# Altium footprint library PcbLib.PcbLib: 141 footprints (part 3 of 9)
Each footprint in its own frame and in the unit in brackets; x right, y up, seen from the top. Pads: shape width x height; smd on the part's side, far side on the other; paste and mask are expansions set on the pad; w line width, h text height; cw(c..) or ccw(c..) is an arc to the next point about the centre after c.
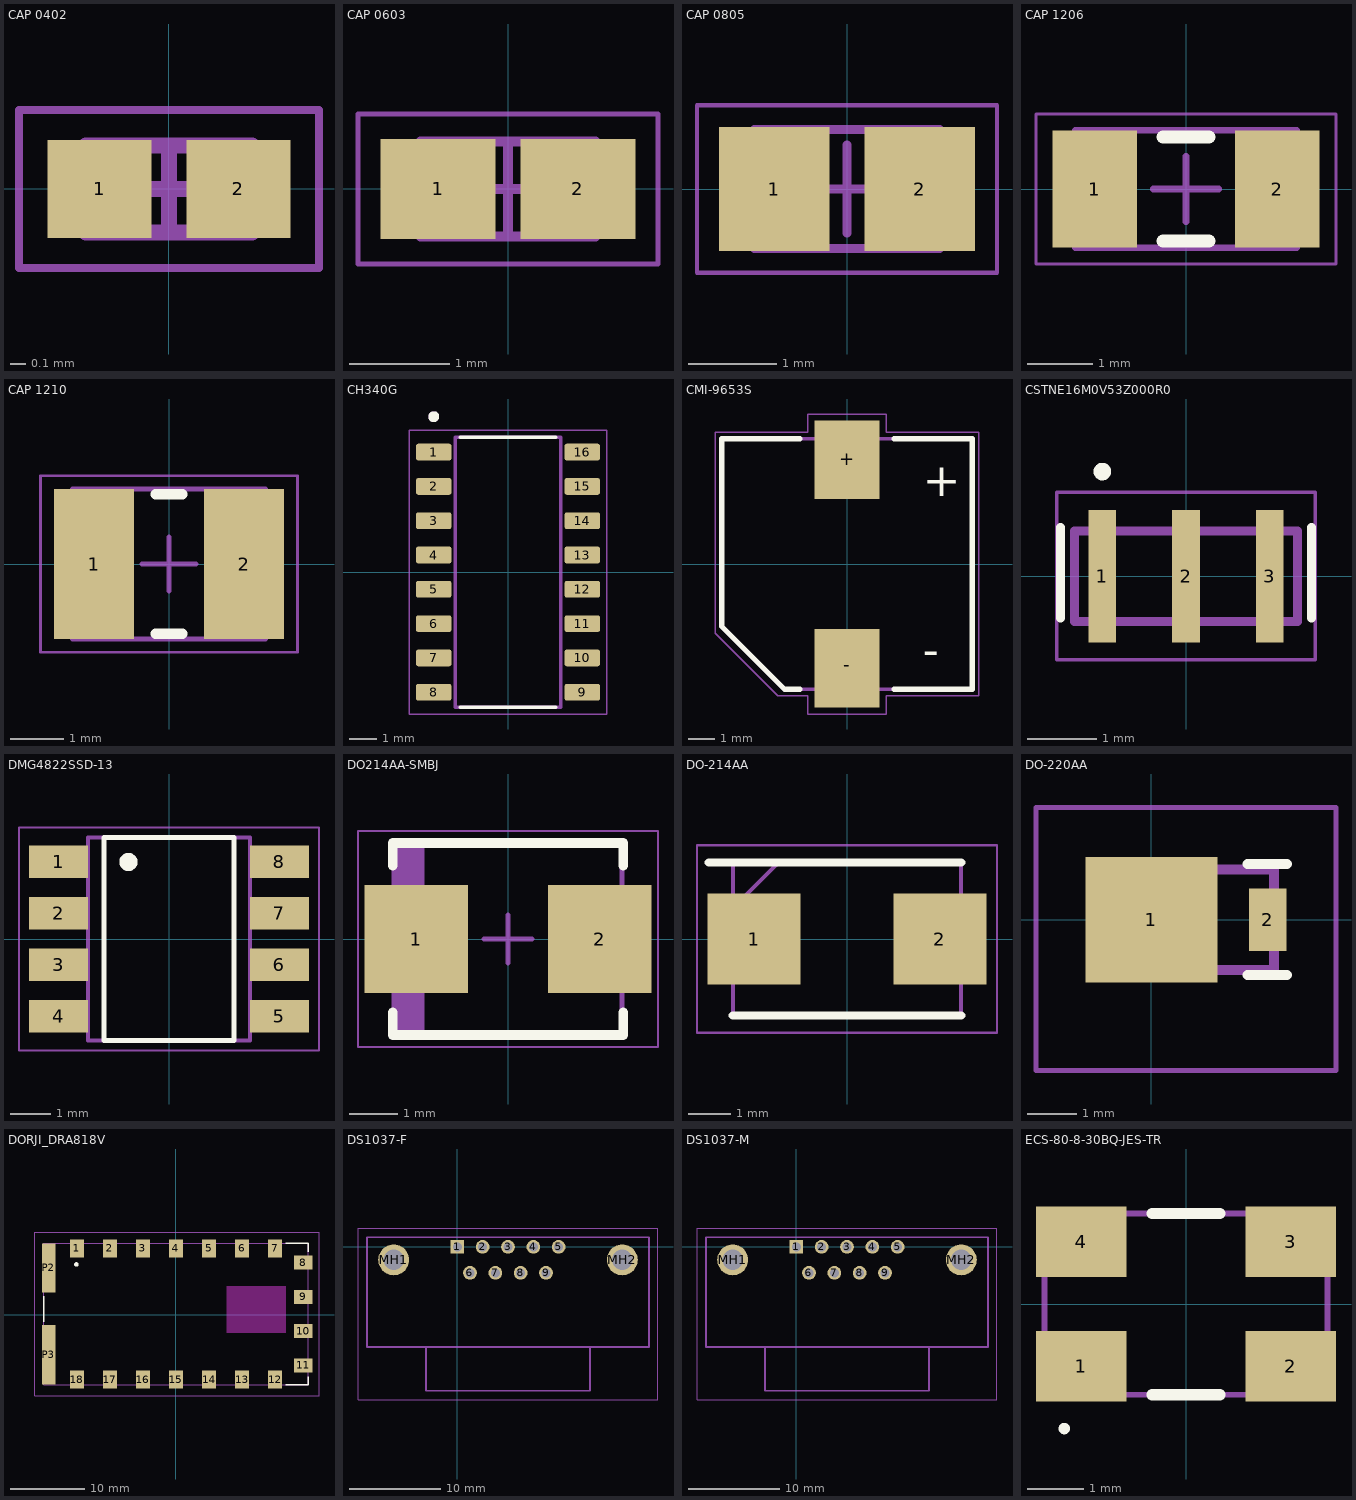
[diagram p2: the footprints below, top view; thin cyan lines are the x and y axes]

## CAP 0402 [mm]
height 0.55
pads (2):
  rect 0.66x0.62 smd: 1(-0.44,0) 2(0.44,0)
Top Courtyard:
  lines w0.05: -0.95,-0.5 -0.95,0.5 0.95,0.5 0.95,-0.5 -0.95,-0.5
  lines w0.1: -0.275,0 0.275,0 ; 0,-0.275 0,0.275
Top Assembly:
  lines w0.1: -0.525,-0.275 -0.525,0.275 0.525,0.275 0.525,-0.275 -0.525,-0.275
3D body "CAP 0402.step": height 0.55, standoff 0, extent -0.525,-0.275 0.525,0.275

## CAP 0603 [mm]
height 0.8
pads (2):
  rect 1.15x1 smd: 1(-0.7,0) 2(0.7,0)
Top Courtyard:
  lines w0.05: -1.5,-0.75 -1.5,0.75 1.5,0.75 1.5,-0.75 -1.5,-0.75
  lines w0.1: -0.475,0 0.475,0 ; 0,-0.475 0,0.475
Top Assembly:
  lines w0.1: -0.875,-0.475 -0.875,0.475 0.875,0.475 0.875,-0.475 -0.875,-0.475
3D body "CAP 0603.step": height 0.95, standoff 0, extent -0.875,-0.475 0.875,0.475

## CAP 0805 [mm]
height 0.85
pads (2):
  rect 1.25x1.4 smd: 1(-0.825,0) 2(0.825,0)
Top Courtyard:
  lines w0.05: -1.7,-0.95 -1.7,0.95 1.7,0.95 1.7,-0.95 -1.7,-0.95
  lines w0.1: -0.5,0 0.5,0 ; 0,-0.5 0,0.5
Top Assembly:
  lines w0.1: -1.05,-0.675 -1.05,0.675 1.05,0.675 1.05,-0.675 -1.05,-0.675
3D body "CAP 0805.step": height 1.25, standoff 0, extent -1.1,-0.725 1.1,0.725

## CAP 1206 [mm]
height 1.6
pads (2):
  rect 1.3x1.8 smd: 1(-1.4,0) 2(1.4,0)
Top Overlay:
  lines w0.2: -0.35,-0.8 0.35,-0.8 ; -0.35,0.8 0.35,0.8
Top Courtyard:
  lines w0.05: -2.3,-1.15 -2.3,1.15 2.3,1.15 2.3,-1.15 -2.3,-1.15
  lines w0.1: -0.5,0 0.5,0 ; 0,-0.5 0,0.5
Top Assembly:
  lines w0.1: -1.7,-0.9 -1.7,0.9 1.7,0.9 1.7,-0.9 -1.7,-0.9
3D body "CAP 1206.step": height 1.6, standoff 0, extent -1.7,-0.9 1.7,0.9

## CAP 1210 [mm]
height 2
pads (2):
  rect 1.5x2.8 smd: 1(-1.4,0) 2(1.4,0)
Top Overlay:
  lines w0.2: -0.25,-1.3 0.25,-1.3 ; -0.25,1.3 0.25,1.3
Top Courtyard:
  lines w0.05: -2.4,-1.65 2.4,-1.65 2.4,1.65 -2.4,1.65 -2.4,-1.65
  lines w0.1: -0.5,0 0.5,0 ; 0,-0.5 0,0.5
Top Assembly:
  lines w0.1: -1.8,-1.4 1.8,-1.4 1.8,1.4 -1.8,1.4 -1.8,-1.4
3D body "CAP 1210.step": height 2, standoff 0, extent -1.8,-1.4 1.8,1.4

## CH340G [mm]
pads (16):
  rrect25% 1.31x0.62 smd: 1(-2.75,4.445) 2(-2.75,3.175) 3(-2.75,1.905) 4(-2.75,0.635) 5(-2.75,-0.635) 6(-2.75,-1.905) 7(-2.75,-3.175) 8(-2.75,-4.445) 9(2.75,-4.445) 10(2.75,-3.175) 11(2.75,-1.905) 12(2.75,-0.635) 13(2.75,0.635) 14(2.75,1.905) 15(2.75,3.175) 16(2.75,4.445)
Top Overlay:
  circle w0.2: c-2.75,5.755 r0.1
  lines w0.127: -1.775,-5 1.775,-5 ; -1.775,5 1.775,5
Mechanical 13:
  circle w0.2: c-2.75,5.755 r0.1
  lines w0.127: -1.95,-5 -1.95,5 1.95,5 1.95,-5 -1.95,-5
Mechanical 15:
  lines w0.05: -3.655,-5.25 -3.655,5.25 3.655,5.25 3.655,-5.25 -3.655,-5.25
3D body "step_temp.STEP": height 1.8, standoff 0, extent -3,-5 3,5

## CMI-9653S [mm]
pads (2):
  rect 2.5x3 smd: +(0,4) -(0,-4)
Top Overlay:
  lines w0.2: -1.8,-4.8 -2.4,-4.8 -4.8,-2.4 -4.8,4.8 -1.8,4.8 ; 1.8,-4.8 4.8,-4.8 4.8,4.8 1.8,4.8
  text "+" at 2.9,2.6 h1.28
  text "-" at 2.9,-3.9 h1.28
Mechanical 13:
  lines w0.127: -4.8,-2.4 -4.8,4.8 4.8,4.8 4.8,-4.8 -2.4,-4.8 -4.8,-2.4
Mechanical 15:
  lines w0.05: -5.05,-2.65 -5.05,5.05 -1.5,5.05 -1.5,5.75 1.5,5.75 1.5,5.05 5.05,5.05 5.05,-5.05 1.5,-5.05 1.5,-5.75 -1.5,-5.75 -1.5,-5.05 -2.65,-5.05 -5.05,-2.65
3D body "step_temp.STEP": height 4.86, standoff -0.14, extent -4.8,-5 4.8,5

## CSTNE16M0V53Z000R0 [mm]
pads (3):
  rect 0.4x1.9 smd: 1(-1.2,0) 2(0,0) 3(1.2,0)
Top Overlay:
  circle w0.15: c-1.2,1.5 r0.05
  lines w0.127: -1.8,-0.6 -1.8,0.7 ; 1.8,-0.6 1.8,0.7
Mechanical 13:
  circle w0.127: c-1.2,1.5 r0.05
  lines w0.127: -1.6,-0.65 1.6,-0.65 1.6,0.65 -1.6,0.65 -1.6,-0.65
Mechanical 15:
  lines w0.05: -1.85,-1.2 1.85,-1.2 1.85,1.2 -1.85,1.2 -1.85,-1.2
3D body "step_temp.STEP": height 1, standoff 0, extent -1.6,-0.65 1.6,0.65

## DMG4822SSD-13 [mm]
pads (8):
  rect 1.45x0.8 smd: 1(-2.725,1.905) 2(-2.725,0.635) 3(-2.725,-0.635) 4(-2.725,-1.905) 5(2.725,-1.905) 6(2.725,-0.635) 7(2.725,0.635) 8(2.725,1.905)
Top Overlay:
  circle w0.25: c-1,1.9 r0.1
  lines w0.127: -1.6,-2.5 1.6,-2.5 1.6,2.5 -1.6,2.5 -1.6,-2.5
Mechanical 13:
  lines w0.1: -2,-2.5 2,-2.5 2,2.5 -2,2.5 -2,-2.5
Mechanical 15:
  lines w0.05: -3.7,-2.75 3.7,-2.75 3.7,2.75 -3.7,2.75 -3.7,-2.75
3D body "DMG4822SSD-13.step": height 1.7, standoff 0, extent -3.099,-2.502 3.099,2.502

## DO214AA-SMBJ [mm]
height 1.99
pads (2):
  rect 2.16x2.26 smd: 1(-1.91,0) 2(1.91,0)
Top Overlay:
  lines w0.2: -2.4,-1.53 -2.4,-2 2.4,-2 2.4,-1.53 ; -2.4,1.53 -2.4,2 2.4,2 2.4,1.53
Top Courtyard:
  lines w0.05: -3.125,-2.25 -3.125,2.25 3.125,2.25 3.125,-2.25 -3.125,-2.25
  lines w0.1: -0.5,0 0.5,0 ; 0,-0.5 0,0.5
Top Assembly:
  rectangle: -2.375,-1.97 -1.736,1.97
  lines w0.1: -2.375,-1.97 -2.375,1.97 2.375,1.97 2.375,-1.97 -2.375,-1.97
3D body "DO214AA-SMBJ.step": height 1.99, standoff 0, extent -2.595,-1.97 2.595,1.97

## DO-214AA [mm]
pads (2):
  rect 2.2x2.15 smd: 1(-2.2,0) 2(2.2,0)
Top Overlay:
  lines w0.2: -3.275,1.81 2.7,1.81 ; -2.7,-1.81 2.7,-1.81
Mechanical 13:
  lines w0.1: -2.7,0.735 -1.625,1.81 ; -2.7,-1.81 2.7,-1.81 2.7,1.81 -2.7,1.81 -2.7,-1.81
Mechanical 15:
  lines w0.05: -3.55,-2.22 3.55,-2.22 3.55,2.22 -3.55,2.22 -3.55,-2.22
3D body "SS26-E3_52T.stp": height 2.44, standoff 0, extent -2.7,-1.81 2.7,1.81

## DO-220AA [mm]
pads (2):
  rect 2.67x2.54 smd: 1(0,0)
  rect 0.762x1.27 smd: 2(2.351,0)
Top Overlay:
  lines w0.2: 1.941,-1.119 2.741,-1.119 ; 1.941,1.124 2.741,1.124
Mechanical 15:
  lines w0.2: -0.925,-1.015 2.475,-1.015 2.475,1.015 -0.925,1.015 -0.925,-1.015
Mechanical 20:
  lines w0.1: -2.335,-3.05 3.731,-3.05 3.731,2.27 -2.335,2.27 -2.335,-3.05
3D body "SS1P3L-M3_84A.stp": height 1.15, standoff 0, extent -1.225,-1.025 2.675,1.025

## DORJI_DRA818V [mm]
pads (20):
  rect 1.88x2.47 smd: 1(-13.35,8.952) 2(-8.9,8.952) 3(-4.45,8.952) 4(0,8.952) 5(4.45,8.952) 6(8.9,8.952) 7(13.35,8.952) 12(13.35,-8.698) 13(8.9,-8.698) 14(4.45,-8.698) 15(0,-8.698) 16(-4.45,-8.698) 17(-8.9,-8.698) 18(-13.35,-8.698)
  rect 2.47x1.88 smd: 8(17.125,7.027) 9(17.125,2.427) 10(17.125,-2.173) 11(17.125,-6.773)
  rect 1.8x6.6 smd: P2(-17.125,6.327)
  rect 1.8x8 smd: P3(-17.125,-5.373)
Top Overlay:
  circle w0.3: c-13.4,6.8 r0.15
  lines w0.2: -17.8,-0.9 -17.8,2.5 ; 14.8,-9.373 17.8,-9.373 17.8,-8.3 ; 14.8,9.627 17.8,9.627 17.8,8.5
Keep-Out Layer:
  region: 14.8,-2.377 6.81,-2.377 6.81,3.877 14.8,3.877
Mechanical 13:
  lines w0.127: -17.8,-9.373 -17.8,9.627 17.8,9.627 17.8,-9.373 -17.8,-9.373
Mechanical 15:
  lines w0.05: -19,-10.873 -19,11.127 19.25,11.127 19.25,-10.873 -19,-10.873
3D body "step_temp.STEP": height 4, standoff 0, extent -17.8,-9.373 17.8,9.627

## DS1037-F [mm]
pads (11):
  rect 1.5x1.5 hole 1: 1(0,0)
  round 1.5 hole 1: 2(2.77,0) 3(5.54,0) 4(8.31,0) 5(11.08,0) 6(1.385,-2.84) 7(4.155,-2.84) 8(6.925,-2.84) 9(9.695,-2.84)
  round 3.391 hole 2.261: MH1(-6.955,-1.42) MH2(18.035,-1.42)
Mechanical 15:
  lines w0.2: -9.86,-10.94 -9.86,1.06 20.94,1.06 20.94,-10.94 -9.86,-10.94 ; -3.41,-15.74 -3.41,-10.94 14.49,-10.94 14.49,-15.74 -3.41,-15.74
Mechanical 20:
  lines w0.1: -10.86,-16.74 -10.86,2.06 21.94,2.06 21.94,-16.74 -10.86,-16.74
3D body "DS1037-9F.STEP": height 12.5, standoff -4.4, extent -9.9,-16.8 21.1,1.5

## DS1037-M [mm]
pads (11):
  rect 1.5x1.5 hole 1: 1(0,0)
  round 1.5 hole 1: 2(2.77,0) 3(5.54,0) 4(8.31,0) 5(11.08,0) 6(1.385,-2.84) 7(4.155,-2.84) 8(6.925,-2.84) 9(9.695,-2.84)
  round 3.391 hole 2.261: MH1(-6.955,-1.42) MH2(18.035,-1.42)
Mechanical 15:
  lines w0.2: -9.86,-10.94 -9.86,1.06 20.94,1.06 20.94,-10.94 -9.86,-10.94 ; -3.41,-15.74 -3.41,-10.94 14.49,-10.94 14.49,-15.74 -3.41,-15.74
Mechanical 20:
  lines w0.1: -10.86,-16.74 -10.86,2.06 21.94,2.06 21.94,-16.74 -10.86,-16.74
3D body "DS1037-9M.STEP": height 12.5, standoff -4.4, extent -9.9,-17 21.1,1.5

## ECS-80-8-30BQ-JES-TR [mm]
pads (4):
  rect 1.6x1.25 smd: 1(-1.85,-1.1) 2(1.85,-1.1) 3(1.85,1.1) 4(-1.85,1.1)
Top Overlay:
  lines w0.1: -2.2,-2.2 ccw(c-2.15,-2.2) -2.1,-2.2 ccw(c-2.15,-2.2) -2.2,-2.2
  lines w0.2: -0.6,-1.6 0.6,-1.6 ; -0.6,1.6 0.6,1.6
Mechanical 15:
  lines w0.1: -2.5,-1.6 2.5,-1.6 2.5,1.6 -2.5,1.6 -2.5,-1.6
3D body "ECS-80-8-30BQ-JES-TR.STEP": height 0.85, standoff 0, extent -2.5,-1.6 2.5,1.6